# Altium footprint library ICL_komponenty_v1.PcbLib: 160 footprints (part 4 of 10)
Each footprint in its own frame and in the unit in brackets; x right, y up, seen from the top. Pads: shape width x height; smd on the part's side, far side on the other; paste and mask are expansions set on the pad; w line width, h text height; cw(c..) or ccw(c..) is an arc to the next point about the centre after c.
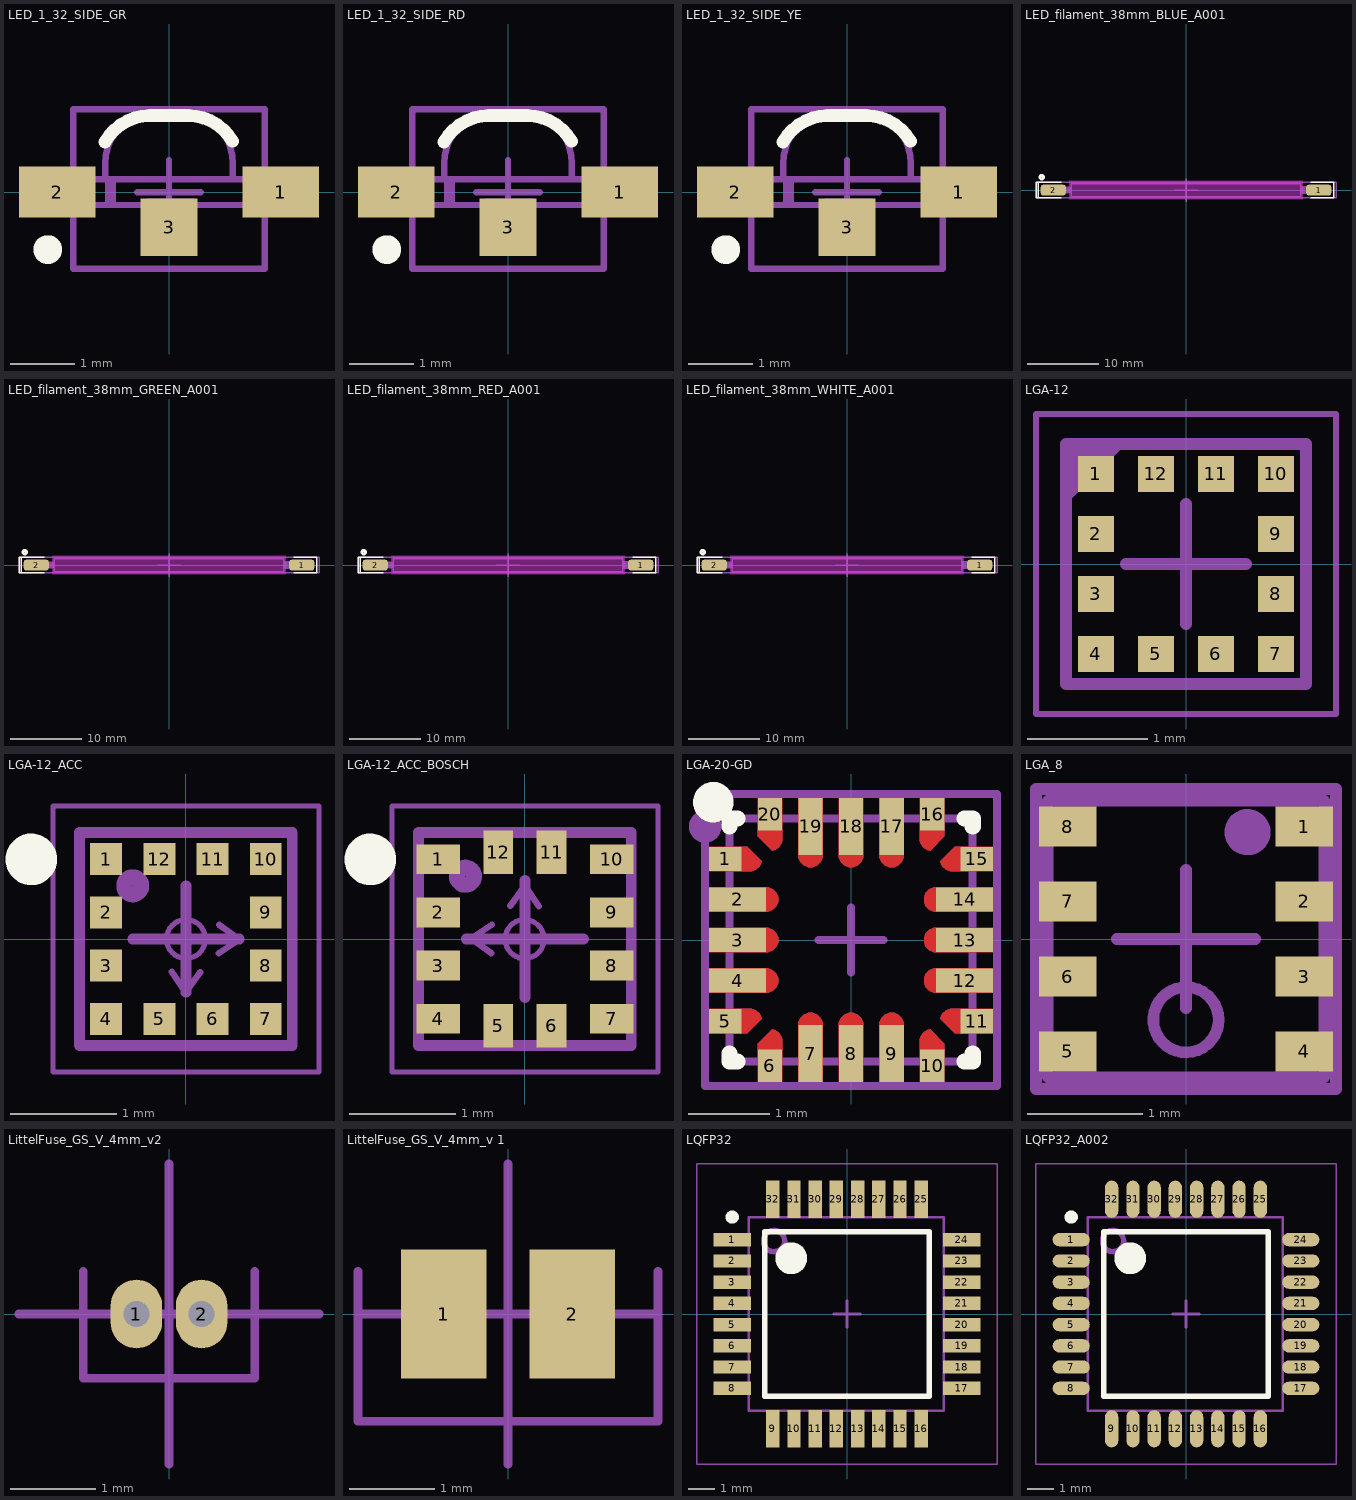
[diagram p3: the footprints below, top view; thin cyan lines are the x and y axes]

## LED_1_32_SIDE_GR [mm] "1x3.2mm side view green LED"
height 0.381
pads (3):
  rect 1.2x0.8 smd: 1(1.75,0) 2(-1.75,0)
  rect 0.9x0.9 smd: 3(0,-0.55)
Top Overlay:
  circle w0.25: c-1.9,-0.9 r0.1
  lines w0.2: -1.001,0.785 cw(c-0.3,0.4) -0.3,1.2 0.3,1.2 cw(c0.3,0.4) 0.995,0.797
Top M11-12_SMOT:
  rectangle: -1.6,-0.2 -1.363,0.199
  rectangle: 1.363,-0.2 1.6,0.199
  rectangle: -0.349,-0.2 0.4,-0.1
  rectangle: -1,-0.2 -0.834,0.2
  lines w0.1: -1,0.2 -1,0.45 cw(c-0.2,0.45) -0.2,1.25 0.2,1.25 cw(c0.2,0.45) 1,0.45 1,0.2 ; -1.6,-0.2 1.6,-0.2 1.6,0.2 -1.6,0.2 -1.6,-0.2
Top M13-14_SDES:
  text "'.Designator'" at -2.732,-1.608 h0.5
Top M15-16_SORG:
  lines w0.1: -0.5,0 0.5,0 ; 0,-0.5 0,0.5 ; -1.5,-1.2 1.5,-1.2 1.5,1.3 -1.5,1.3 -1.5,-1.2
3D body "APA3010GCCK_GREEN.step": height 1, standoff 0.01, extent -1.5,-0.7 1.5,1.3

## LED_1_32_SIDE_RD [mm] "1x3.2mm side view red LED"
height 0.381
pads (3):
  rect 1.2x0.8 smd: 1(1.75,0) 2(-1.75,0)
  rect 0.9x0.9 smd: 3(0,-0.55)
Top Overlay:
  circle w0.25: c-1.9,-0.9 r0.1
  lines w0.2: -1.001,0.785 cw(c-0.3,0.4) -0.3,1.2 0.3,1.2 cw(c0.3,0.4) 0.995,0.797
Top M11-12_SMOT:
  rectangle: -1,-0.2 -0.834,0.2
  rectangle: -0.349,-0.2 0.4,-0.1
  rectangle: 1.363,-0.2 1.6,0.199
  rectangle: -1.6,-0.2 -1.363,0.199
  lines w0.1: -1,0.2 -1,0.45 cw(c-0.2,0.45) -0.2,1.25 0.2,1.25 cw(c0.2,0.45) 1,0.45 1,0.2 ; -1.6,-0.2 -1.6,0.2 1.6,0.2 1.6,-0.2 -1.6,-0.2
Top M13-14_SDES:
  text "'.Designator'" at -2.732,-1.608 h0.5
Top M15-16_SORG:
  lines w0.1: -0.5,0 0.5,0 ; 0,-0.5 0,0.5 ; -1.5,-1.2 -1.5,1.3 1.5,1.3 1.5,-1.2 -1.5,-1.2
3D body "APA3010GCCK_RED.step": height 1, standoff 0.01, extent -1.5,-0.7 1.5,1.3

## LED_1_32_SIDE_YE [mm] "1x3.2mm side view yelow LED"
height 0.381
pads (3):
  rect 1.2x0.8 smd: 1(1.75,0) 2(-1.75,0)
  rect 0.9x0.9 smd: 3(0,-0.55)
Top Overlay:
  circle w0.25: c-1.9,-0.9 r0.1
  lines w0.2: -1.001,0.785 cw(c-0.3,0.4) -0.3,1.2 0.3,1.2 cw(c0.3,0.4) 0.995,0.797
Top M11-12_SMOT:
  rectangle: -1,-0.2 -0.834,0.2
  rectangle: -0.349,-0.2 0.4,-0.1
  rectangle: 1.363,-0.2 1.6,0.199
  rectangle: -1.6,-0.2 -1.363,0.199
  lines w0.1: -1,0.2 -1,0.45 cw(c-0.2,0.45) -0.2,1.25 0.2,1.25 cw(c0.2,0.45) 1,0.45 1,0.2 ; -1.6,-0.2 -1.6,0.2 1.6,0.2 1.6,-0.2 -1.6,-0.2
Top M13-14_SDES:
  text "'.Designator'" at -2.732,-1.608 h0.5
Top M15-16_SORG:
  lines w0.1: -0.5,0 0.5,0 ; 0,-0.5 0,0.5 ; -1.5,-1.2 -1.5,1.3 1.5,1.3 1.5,-1.2 -1.5,-1.2
3D body "APA3010GCCK_YELLOW.step": height 1, standoff 0.01, extent -1.5,-0.7 1.5,1.3

## LED_filament_38mm_BLUE_A001 [mm]
pads (2):
  rrect50% 3.5x1.5 smd: 1(18.5,0) 2(-18.5,0)
Top Overlay:
  circle w0.4: c-20.1,1.8 r0.25
  lines w0.2: -17.4,-1.1 -20.6,-1.1 ; -17.4,1.1 -20.6,1.1 ; 17.4,-1.1 20.6,-1.1 20.6,1.1 17.4,1.1 ; -20.6,-1.1 -20.9,-1.1 -20.9,1.1 -20.6,1.1 ; -20.6,-1.1 -20.6,1.1
Keep-Out Layer:
  board cut-out: -16.3,1.3 -16.3,-1.3 16.3,-1.3 16.3,1.3
Top M11-12_SMOT:
  circle w0.2: c16.9,0 r0.361
  rectangle: -19.1,-0.5 -16,0.5
  region: 19.1,0.5 17.261,0.5 17.261,-0.5 19.1,-0.5
  region: 16.9,0.5 16,0.5 16,-0.5 16.9,-0.5 16.9,-0.361 16.879,-0.361 16.813,-0.354 16.691,-0.303 16.597,-0.21 16.547,-0.087 16.54,-0.021 16.54,0.001 16.547,0.071 16.601,0.201 16.7,0.3 16.83,0.354 16.9,0.361
  region: 17.3,0.5 16.9,0.5 16.9,0.361 16.97,0.354 17.1,0.3 17.2,0.2 17.254,0.07 17.261,0 17.261,-0.005 17.254,-0.074 17.201,-0.203 17.103,-0.301 16.974,-0.354 16.905,-0.361 16.9,-0.361 16.9,-0.5 17.3,-0.5
  lines w0.2: -16,-0.9 16,-0.9 16,0.9 -16,0.9 -16,-0.9
Top M15-16_SORG:
  lines w0.2: -1.6,0 0,0 ; 0,-1.6 0,0 ; 0,1.6 0,0 ; 1.6,0 0,0 ; -20.9,-1.1 20.9,-1.1 20.9,1.1 -20.9,1.1 -20.9,-1.1
3D body "fil_38mm_blue.stp": height 0.76, standoff -1.04, extent -19,-0.9 19,0.9

## LED_filament_38mm_GREEN_A001 [mm]
pads (2):
  rrect50% 3.5x1.5 smd: 1(18.5,0) 2(-18.5,0)
Top Overlay:
  circle w0.4: c-20.1,1.8 r0.25
  lines w0.2: -17.4,-1.1 -20.6,-1.1 ; -17.4,1.1 -20.6,1.1 ; 17.4,-1.1 20.6,-1.1 20.6,1.1 17.4,1.1 ; -20.6,-1.1 -20.6,1.1 ; -20.6,-1.1 -20.9,-1.1 -20.9,1.1 -20.6,1.1
Keep-Out Layer:
  board cut-out: -16.3,1.3 -16.3,-1.3 16.3,-1.3 16.3,1.3
Top M11-12_SMOT:
  circle w0.2: c16.9,0 r0.361
  region: 19.1,0.5 17.261,0.5 17.261,-0.5 19.1,-0.5
  rectangle: -19.1,-0.5 -16,0.5
  region: 17.3,0.5 16.9,0.5 16.9,0.361 16.97,0.354 17.1,0.3 17.2,0.2 17.254,0.07 17.261,0 17.261,-0.005 17.254,-0.074 17.201,-0.203 17.103,-0.301 16.974,-0.354 16.905,-0.361 16.9,-0.361 16.9,-0.5 17.3,-0.5
  region: 16.9,0.5 16,0.5 16,-0.5 16.9,-0.5 16.9,-0.361 16.879,-0.361 16.813,-0.354 16.691,-0.303 16.597,-0.21 16.547,-0.087 16.54,-0.021 16.54,0.001 16.547,0.071 16.601,0.201 16.7,0.3 16.83,0.354 16.9,0.361
  lines w0.2: -16,-0.9 -16,0.9 16,0.9 16,-0.9 -16,-0.9
Top M15-16_SORG:
  lines w0.2: -1.6,0 0,0 ; 0,-1.6 0,0 ; 0,1.6 0,0 ; 1.6,0 0,0 ; -20.9,-1.1 -20.9,1.1 20.9,1.1 20.9,-1.1 -20.9,-1.1
3D body "fil_38mm_green.stp": height 0.76, standoff -1.04, extent -19,-0.9 19,0.9

## LED_filament_38mm_RED_A001 [mm]
pads (2):
  rrect50% 3.5x1.5 smd: 1(18.5,0) 2(-18.5,0)
Top Overlay:
  circle w0.4: c-20.1,1.8 r0.25
  lines w0.2: -17.4,-1.1 -20.6,-1.1 ; -17.4,1.1 -20.6,1.1 ; 17.4,-1.1 20.6,-1.1 20.6,1.1 17.4,1.1 ; -20.6,-1.1 -20.6,1.1 ; -20.6,-1.1 -20.9,-1.1 -20.9,1.1 -20.6,1.1
Keep-Out Layer:
  board cut-out: -16.3,1.3 -16.3,-1.3 16.3,-1.3 16.3,1.3
Top M11-12_SMOT:
  circle w0.2: c16.9,0 r0.361
  region: 19.1,0.5 17.261,0.5 17.261,-0.5 19.1,-0.5
  rectangle: -19.1,-0.5 -16,0.5
  region: 17.3,0.5 16.9,0.5 16.9,0.361 16.97,0.354 17.1,0.3 17.2,0.2 17.254,0.07 17.261,0 17.261,-0.005 17.254,-0.074 17.201,-0.203 17.103,-0.301 16.974,-0.354 16.905,-0.361 16.9,-0.361 16.9,-0.5 17.3,-0.5
  region: 16.9,0.5 16,0.5 16,-0.5 16.9,-0.5 16.9,-0.361 16.879,-0.361 16.813,-0.354 16.691,-0.303 16.597,-0.21 16.547,-0.087 16.54,-0.021 16.54,0.001 16.547,0.071 16.601,0.201 16.7,0.3 16.83,0.354 16.9,0.361
  lines w0.2: -16,-0.9 -16,0.9 16,0.9 16,-0.9 -16,-0.9
Top M15-16_SORG:
  lines w0.2: -1.6,0 0,0 ; 0,-1.6 0,0 ; 0,1.6 0,0 ; 1.6,0 0,0 ; -20.9,-1.1 -20.9,1.1 20.9,1.1 20.9,-1.1 -20.9,-1.1
3D body "fil_38mm_red.stp": height 0.76, standoff -1.04, extent -19,-0.9 19,0.9

## LED_filament_38mm_WHITE_A001 [mm]
pads (2):
  rrect50% 3.5x1.5 smd: 1(18.5,0) 2(-18.5,0)
Top Overlay:
  circle w0.4: c-20.1,1.8 r0.25
  lines w0.2: -17.4,-1.1 -20.6,-1.1 ; -17.4,1.1 -20.6,1.1 ; 17.4,-1.1 20.6,-1.1 20.6,1.1 17.4,1.1 ; -20.6,-1.1 -20.6,1.1 ; -20.6,-1.1 -20.9,-1.1 -20.9,1.1 -20.6,1.1
Keep-Out Layer:
  board cut-out: -16.3,1.3 -16.3,-1.3 16.3,-1.3 16.3,1.3
Top M11-12_SMOT:
  circle w0.2: c16.9,0 r0.361
  region: 19.1,0.5 17.261,0.5 17.261,-0.5 19.1,-0.5
  rectangle: -19.1,-0.5 -16,0.5
  region: 16.9,0.5 16,0.5 16,-0.5 16.9,-0.5 16.9,-0.361 16.879,-0.361 16.813,-0.354 16.691,-0.303 16.597,-0.21 16.547,-0.087 16.54,-0.021 16.54,0.001 16.547,0.071 16.601,0.201 16.7,0.3 16.83,0.354 16.9,0.361
  region: 17.3,0.5 16.9,0.5 16.9,0.361 16.97,0.354 17.1,0.3 17.2,0.2 17.254,0.07 17.261,0 17.261,-0.005 17.254,-0.074 17.201,-0.203 17.103,-0.301 16.974,-0.354 16.905,-0.361 16.9,-0.361 16.9,-0.5 17.3,-0.5
  lines w0.2: -16,-0.9 16,-0.9 16,0.9 -16,0.9 -16,-0.9
Top M15-16_SORG:
  lines w0.2: -1.6,0 0,0 ; 0,-1.6 0,0 ; 0,1.6 0,0 ; 1.6,0 0,0 ; -20.9,-1.1 20.9,-1.1 20.9,1.1 -20.9,1.1 -20.9,-1.1
3D body "fil_38mm_white.stp": height 0.76, standoff -1.04, extent -19,-0.9 19,0.9

## LGA-12 [mm] "LGA, 12-Leads, Body 2,00x2,00mmx0,70mm, Pitch 0,50mm"
height 0.7
pads (12):
  rect 0.3x0.3 smd mask+0.1: 1(-0.75,0.75) 2(-0.75,0.25) 3(-0.75,-0.25) 4(-0.75,-0.75) 5(-0.25,-0.75) 6(0.25,-0.75) 7(0.75,-0.75) 8(0.75,-0.25) 9(0.75,0.25) 10(0.75,0.75) 11(0.25,0.75) 12(-0.25,0.75)
Top Solder:
  rectangle: -1,0.5 1,1
  rectangle: 0.5,-0.7 1,0.7
  rectangle: -1,-1 1,-0.5
  rectangle: -1,-0.7 -0.5,0.7
Top M11-12_SMOT:
  rectangle: -0.35,0.65 -0.15,0.85
  rectangle: -0.85,0.65 -0.65,0.85
  rectangle: 0.15,0.65 0.35,0.85
  rectangle: 0.65,0.65 0.85,0.85
  rectangle: 0.65,0.15 0.85,0.35
  rectangle: -0.85,0.15 -0.65,0.35
  rectangle: -0.85,-0.35 -0.65,-0.15
  rectangle: 0.65,-0.35 0.85,-0.15
  rectangle: 0.65,-0.85 0.85,-0.65
  rectangle: 0.15,-0.85 0.35,-0.65
  rectangle: -0.35,-0.85 -0.15,-0.65
  rectangle: -0.85,-0.85 -0.65,-0.65
  region: -1,1 -0.5,1 -1,0.5
  lines w0.1: -1,-1 1,-1 1,1 -1,1 -1,-1
Top M13-14_SDES:
  text "'.Designator'" at -3.399,-0.25 h0.6
Top M15-16_SORG:
  lines w0.05: -1.25,-1.25 -1.25,1.25 1.25,1.25 1.25,-1.25 -1.25,-1.25
  lines w0.1: -0.5,0 0.5,0 ; 0,-0.5 0,0.5
3D body: height 0.7, standoff 0, extent -1,-1 1,1

## LGA-12_ACC [mm] "LGA, 12-Leads, Body 2,00x2,00mmx0,70mm, Pitch 0,50mm"
height 0.7
pads (12):
  rect 0.3x0.3 smd mask+0.1: 1(-0.75,0.75) 2(-0.75,0.25) 3(-0.75,-0.25) 4(-0.75,-0.75) 5(-0.25,-0.75) 6(0.25,-0.75) 7(0.75,-0.75) 8(0.75,-0.25) 9(0.75,0.25) 10(0.75,0.75) 11(0.25,0.75) 12(-0.25,0.75)
Top Overlay:
  circle w0.254: c-1.453,0.748 r0.115
Top Solder:
  rectangle: -1,0.5 1,1
  rectangle: 0.5,-0.7 1,0.7
  rectangle: -1,-1 1,-0.5
  rectangle: -1,-0.7 -0.5,0.7
Top M11-12_SMOT:
  circle w0.15: c-0.5,0.5 r0.08
  rectangle: -0.35,0.65 -0.15,0.85
  rectangle: -0.85,0.65 -0.65,0.85
  rectangle: 0.15,0.65 0.35,0.85
  rectangle: 0.65,0.65 0.85,0.85
  rectangle: 0.65,0.15 0.85,0.35
  rectangle: 0.65,-0.35 0.85,-0.15
  rectangle: -0.85,-0.35 -0.65,-0.15
  rectangle: -0.85,0.15 -0.65,0.35
  rectangle: -0.85,-0.85 -0.65,-0.65
  rectangle: -0.35,-0.85 -0.15,-0.65
  rectangle: 0.15,-0.85 0.35,-0.65
  rectangle: 0.65,-0.85 0.85,-0.65
  lines w0.1: -1,-1 1,-1 1,1 -1,1 -1,-1
Top M13-14_SDES:
  text "'.Designator'" at -3.399,-0.25 h0.6
Top M15-16_SORG:
  lines w0.05: -1.25,-1.25 -1.25,1.25 1.25,1.25 1.25,-1.25 -1.25,-1.25
  lines w0.1: -0.5,0 0,0 ; 0,-0.5 0,0 ; 0,0.5 0,0 ; 0.5,0 0,0
Bottom M15-16_SORG:
  circle w0.05: c0,0 r0.182
  circle w0.05: c-0.001,-0.002 r0.047
  lines w0.06: -0.5,0 0.5,0 0.312,0.133 ; -0.135,-0.308 -0.002,-0.506 ; 0,0.5 0,-0.5 0.133,-0.312 ; 0.308,-0.135 0.506,-0.002
  text "Z+" at -0.465,0.116 h0.2
  text "X+" at 0.615,-0.097 h0.2
  text "Y+" at -0.062,-0.862 h0.2
3D body: height 0.7, standoff 0, extent -1,-1 1,1

## LGA-12_ACC_BOSCH [mm] "LGA, 12-Leads, Body 2,00x2,00mmx0,70mm, Pitch 0,50mm"
height 0.7
pads (12):
  rect 0.41x0.28 smd mask+0.1: 1(-0.815,0.75) 2(-0.815,0.25) 3(-0.815,-0.25) 4(-0.815,-0.75) 7(0.815,-0.75) 8(0.815,-0.25) 9(0.815,0.25) 10(0.815,0.75)
  rect 0.28x0.41 smd mask+0.1: 5(-0.25,-0.815) 6(0.25,-0.815) 11(0.25,0.815) 12(-0.25,0.815)
Top Overlay:
  circle w0.254: c-1.453,0.748 r0.115
Top Solder:
  rectangle: -1,-0.7 -0.5,0.7
  rectangle: -1,-1 1,-0.5
  rectangle: 0.5,-0.999 1.117,0.988
  rectangle: -0.65,0.5 1.119,0.989
  rectangle: -1.116,-0.991 -0.503,0.99
  rectangle: -0.119,0.9 0.15,1.119
  rectangle: -0.112,-1.118 0.2,-0.95
Top M11-12_SMOT:
  circle w0.15: c-0.56,0.59 r0.08
  rectangle: -0.3,0.7 -0.2,0.9
  rectangle: 0.2,0.7 0.3,0.9
  region: -0.7,0.7 -0.7,0.8 -0.9,0.8 -0.9,0.7
  region: -0.7,0.2 -0.7,0.3 -0.9,0.3 -0.9,0.2
  region: -0.7,-0.3 -0.7,-0.2 -0.9,-0.2 -0.9,-0.3
  region: -0.7,-0.8 -0.7,-0.7 -0.9,-0.7 -0.9,-0.8
  region: 0.7,-0.7 0.7,-0.8 0.9,-0.8 0.9,-0.7
  region: 0.7,-0.2 0.7,-0.3 0.9,-0.3 0.9,-0.2
  region: 0.7,0.3 0.7,0.2 0.9,0.2 0.9,0.3
  region: 0.7,0.8 0.7,0.7 0.9,0.7 0.9,0.8
  region: 0.3,-0.7 0.2,-0.7 0.2,-0.9 0.3,-0.9
  region: -0.2,-0.7 -0.3,-0.7 -0.3,-0.9 -0.2,-0.9
  lines w0.1: -1,-1 1,-1 1,1 -1,1 -1,-1
Top M13-14_SDES:
  text "'.Designator'" at -3.399,-0.25 h0.6
Top M15-16_SORG:
  lines w0.05: -1.25,-1.25 1.25,-1.25 1.25,1.25 -1.25,1.25 -1.25,-1.25
  lines w0.1: -0.55,0 0,0 ; 0,-0.55 0,0 ; 0,0.55 0,0 ; 0.55,0 0,0
Bottom M15-16_SORG:
  circle w0.05: c-0.001,-0.001 r0.047
  circle w0.05: c-0.003,0 r0.182
  lines w0.06: -0.509,0.002 -0.312,0.134 ; -0.315,-0.134 -0.503,0 0.497,0 ; -0.137,0.311 -0.003,0.5 -0.003,-0.5 ; -0.001,0.505 0.131,0.308
  text "Z+" at -0.119,-0.466 h0.2
  text "Y+" at -0.601,-0.167 h0.2
  text "X+" at 0.094,0.614 h0.2
3D body: height 0.7, standoff 0, extent -1,-1 1,1

## LGA-20-GD [mm] "GigaDevice LGA20"
height 0.61
pads (20):
  rect 0.4x0.3 smd paste-0.15 mask-0.15: 1(-1.55,1) 5(-1.55,-1) 11(1.55,-1) 15(1.55,1)
  rect 0.7x0.3 smd paste-0.15 mask-0.15: 2(-1.4,0.5) 3(-1.4,0) 4(-1.4,-0.5) 12(1.4,-0.5) 13(1.4,0) 14(1.4,0.5)
  rect 0.3x0.4 smd paste-0.15 mask-0.15: 6(-1,-1.55) 10(1,-1.55) 16(1,1.55) 20(-1,1.55)
  rect 0.3x0.7 smd paste-0.15 mask-0.15: 7(-0.5,-1.4) 8(0,-1.4) 9(0.5,-1.4) 17(0.5,1.4) 18(0,1.4) 19(-0.5,1.4)
Top Layer:
  region: -1.75,0.85 -1.25,0.85 -1.224,0.85 -1.174,0.868 -1.133,0.902 -1.107,0.948 -1.102,0.974 -1.278,1.15 -1.75,1.15
  region: -1.15,1.278 -1.15,1.75 -0.85,1.75 -0.85,1.25 -0.85,1.224 -0.868,1.174 -0.902,1.133 -0.948,1.107 -0.974,1.102
  region: -0.65,1.05 -0.65,1.75 -0.35,1.75 -0.35,1.05 -0.35,1.02 -0.373,0.965 -0.415,0.923 -0.47,0.9 -0.53,0.9 -0.585,0.923 -0.627,0.965 -0.65,1.02
  region: -0.15,1.05 -0.15,1.02 -0.127,0.965 -0.085,0.923 -0.03,0.9 0.03,0.9 0.085,0.923 0.127,0.965 0.15,1.02 0.15,1.05 0.15,1.75 -0.15,1.75
  region: 0.35,1.05 0.35,1.02 0.373,0.965 0.415,0.923 0.47,0.9 0.53,0.9 0.585,0.923 0.627,0.965 0.65,1.02 0.65,1.05 0.65,1.75 0.35,1.75
  region: 0.85,1.25 0.85,1.75 1.15,1.75 1.15,1.278 0.974,1.102 0.948,1.107 0.902,1.133 0.868,1.174 0.85,1.224
  region: 1.102,0.974 1.107,0.948 1.133,0.902 1.174,0.868 1.224,0.85 1.25,0.85 1.75,0.85 1.75,1.15 1.278,1.15
  region: 1.05,0.35 1.02,0.35 0.965,0.373 0.923,0.415 0.9,0.47 0.9,0.53 0.923,0.585 0.965,0.627 1.02,0.65 1.05,0.65 1.75,0.65 1.75,0.35
  region: 1.05,-0.15 1.75,-0.15 1.75,0.15 1.05,0.15 1.02,0.15 0.965,0.127 0.923,0.085 0.9,0.03 0.9,-0.03 0.923,-0.085 0.965,-0.127 1.02,-0.15
  region: 1.05,-0.65 1.02,-0.65 0.965,-0.627 0.923,-0.585 0.9,-0.53 0.9,-0.47 0.923,-0.415 0.965,-0.373 1.02,-0.35 1.05,-0.35 1.75,-0.35 1.75,-0.65
  region: 1.102,-0.974 1.278,-1.15 1.75,-1.15 1.75,-0.85 1.25,-0.85 1.224,-0.85 1.174,-0.868 1.133,-0.902 1.107,-0.948
  region: 0.85,-1.75 1.15,-1.75 1.15,-1.278 0.974,-1.102 0.948,-1.107 0.902,-1.133 0.868,-1.174 0.85,-1.224 0.85,-1.25
  region: 0.35,-1.75 0.35,-1.05 0.35,-1.02 0.373,-0.965 0.415,-0.923 0.47,-0.9 0.53,-0.9 0.585,-0.923 0.627,-0.965 0.65,-1.02 0.65,-1.05 0.65,-1.75
  region: -0.15,-1.75 -0.15,-1.05 -0.15,-1.02 -0.127,-0.965 -0.085,-0.923 -0.03,-0.9 0.03,-0.9 0.085,-0.923 0.127,-0.965 0.15,-1.02 0.15,-1.05 0.15,-1.75
  region: -0.65,-1.75 -0.35,-1.75 -0.35,-1.05 -0.35,-1.02 -0.373,-0.965 -0.415,-0.923 -0.47,-0.9 -0.53,-0.9 -0.585,-0.923 -0.627,-0.965 -0.65,-1.02 -0.65,-1.05
  region: -1.15,-1.75 -0.85,-1.75 -0.85,-1.25 -0.85,-1.224 -0.868,-1.174 -0.902,-1.133 -0.948,-1.107 -0.974,-1.102 -1.15,-1.278
  region: -1.75,-1.15 -1.278,-1.15 -1.102,-0.974 -1.107,-0.948 -1.133,-0.902 -1.174,-0.868 -1.224,-0.85 -1.25,-0.85 -1.75,-0.85
  region: -1.75,-0.65 -1.05,-0.65 -1.02,-0.65 -0.965,-0.627 -0.923,-0.585 -0.9,-0.53 -0.9,-0.47 -0.923,-0.415 -0.965,-0.373 -1.02,-0.35 -1.05,-0.35 -1.75,-0.35
  region: -1.75,-0.15 -1.75,0.15 -1.05,0.15 -1.02,0.15 -0.965,0.127 -0.923,0.085 -0.9,0.03 -0.9,-0.03 -0.923,-0.085 -0.965,-0.127 -1.02,-0.15 -1.05,-0.15
  region: -1.75,0.35 -1.75,0.65 -1.05,0.65 -1.02,0.65 -0.965,0.627 -0.923,0.585 -0.9,0.53 -0.9,0.47 -0.923,0.415 -0.965,0.373 -1.02,0.35 -1.05,0.35
Top Overlay:
  circle w0.25: c-1.7,1.7 r0.125
  lines w0.2: -1.5,-1.4 -1.5,-1.5 -1.4,-1.5 ; -1.5,1.4 -1.5,1.5 -1.4,1.5 ; 1.4,-1.5 1.5,-1.5 1.5,-1.4 ; 1.4,1.5 1.5,1.5 1.5,1.4
Top Paste:
  drawing of 20 lines, arcs and shapes, not listed
Top Solder:
  region: -0.838,0.838 -1.198,1.198 -1.198,1.8 1.2,1.8 1.2,1.207 0.831,0.838
  region: -0.836,-0.836 -1.198,-1.198 -1.8,-1.198 -1.8,1.2 -1.2,1.2 -0.836,0.836
  region: 0.837,-0.837 1.198,-1.198 1.198,-1.8 -1.2,-1.8 -1.2,-1.2 -0.837,-0.837
  region: 0.833,0.839 1.192,1.198 1.8,1.198 1.8,-1.2 1.2,-1.2 0.833,-0.833
Top M11-12_SMOT:
  drawing of 26 lines, arcs and shapes, not listed
Top M13-14_SDES:
  text "'.Designator'" at -3.399,-0.25 h0.6
Top M15-16_SORG:
  lines w0.1: -0.4,0 0.4,0 ; 0,-0.4 0,0.4 ; -1.8,-1.8 -1.8,1.8 1.8,1.8 1.8,-1.8 -1.8,-1.8
3D body "LGA-20-GD.step": height 0.61, standoff 0, extent -1.55,-1.55 1.55,1.55

## LGA_8 [mm] "BME280 bosh"
pads (8):
  rect 0.5x0.35 smd: 1(1.025,0.975) 2(1.025,0.325) 3(1.025,-0.325) 4(1.025,-0.975) 5(-1.025,-0.975) 6(-1.025,-0.325) 7(-1.025,0.325) 8(-1.025,0.975)
Top M11-12_SMOT:
  circle w0.2: c0.533,0.926 r0.1
  circle w0.1: c0,-0.7 r0.283
  rectangle: -1.2,-0.449 -0.808,-0.2
  rectangle: -1.2,-1.099 -0.808,-0.85
  rectangle: -1.2,0.851 -0.808,1.1
  rectangle: -1.2,0.201 -0.808,0.45
  region: 1.2,-0.851 0.808,-0.851 0.808,-1.1 1.2,-1.1
  region: 1.2,-0.201 0.808,-0.201 0.808,-0.45 1.2,-0.45
  region: 1.2,0.449 0.808,0.449 0.808,0.2 1.2,0.2
  region: 1.2,1.099 0.808,1.099 0.808,0.85 1.2,0.85
  lines w0.1: -1.2,-1.2 -1.2,1.2 1.2,1.2 1.2,-1.2 -1.2,-1.2
Top M13-14_SDES:
  text "'.Designator'" at 0.25,-3.399 h0.6
Top M15-16_SORG:
  lines w0.1: -0.6,0 0,0 ; 0,-0.6 0,0 ; 0,0.6 0,0 ; 0.6,0 0,0 ; -1.3,-1.3 -1.3,1.3 1.3,1.3 1.3,-1.3 -0.9,-1.3 -1.3,-1.3
3D body "Bosch_BME280.step": height 0.94, standoff 0.01, extent -1.25,-1.25 1.25,1.25

## LittelFuse_GS_V_4mm_v2 [mm] "NTC glass drop"
pads (2):
  oval 0.6x0.8 hole 0.3: 1(-0.38,0) 2(0.38,0)
Top M15-16_SORG:
  lines w0.1: -1.75,0 0,0 ; 0,-1.75 0,0 ; 0,1.75 0,0 ; 1.75,0 0,0
Top M17-18_TDES:
  text "'.Designator'" at -5.715,1.433 h1
Top M19-20_TMOT:
  lines w0.1: -1,0.5 -1,-0.75 1,-0.75 1,0.5
3D body "littelfuse_GS_v3.STEP": height 0.91, standoff -2.35, extent -0.762,-0.138 0.762,5.762

## LittelFuse_GS_V_4mm_v 1 [mm] "NTC glass drop"
pads (2):
  rect 1x1.5 smd: 1(-0.75,0) 2(0.75,0)
Top M15-16_SORG:
  lines w0.1: -1.75,0 0,0 ; 0,-1.75 0,0 ; 0,1.75 0,0 ; 1.75,0 0,0
Top M17-18_TDES:
  text "'.Designator'" at -5.715,1.433 h1
Top M19-20_TMOT:
  lines w0.1: -1.75,0.5 -1.75,-1.25 1.75,-1.25 1.75,0.5
3D body "littelfuse_GS_v2.STEP": height 0.56, standoff -0.96, extent -0.762,-0.667 0.762,5.762

## LQFP32 [mm] "TQFP, 32-Leads, Body 7,00x7,00mm, Pitch 0,80mm, IPC Low Density"
height 1.6
pads (32):
  rect 1.4x0.5 smd: 1(-4.325,2.8) 2(-4.325,2) 3(-4.325,1.2) 4(-4.325,0.4) 5(-4.325,-0.4) 6(-4.325,-1.2) 7(-4.325,-2) 8(-4.325,-2.8) 17(4.325,-2.8) 18(4.325,-2) 19(4.325,-1.2) 20(4.325,-0.4) 21(4.325,0.4) 22(4.325,1.2) 23(4.325,2) 24(4.325,2.8)
  rect 0.5x1.4 smd: 9(-2.8,-4.325) 10(-2,-4.325) 11(-1.2,-4.325) 12(-0.4,-4.325) 13(0.4,-4.325) 14(1.2,-4.325) 15(2,-4.325) 16(2.8,-4.325) 25(2.8,4.325) 26(2,4.325) 27(1.2,4.325) 28(0.4,4.325) 29(-0.4,4.325) 30(-1.2,4.325) 31(-2,4.325) 32(-2.8,4.325)
Top Overlay:
  circle w0.25: c-4.325,3.65 r0.125
  circle w0.6: c-2.1,2.1 r0.3
  lines w0.2: -3.1,-3.1 -3.1,3.1 3.1,3.1 3.1,-3.1 -3.1,-3.1
Top M11-12_SMOT:
  circle w0.2: c-2.75,2.75 r0.4
  region: -3.65,2.65 -3.65,2.95 -4.45,2.95 -4.45,2.65
  region: -3.65,1.85 -3.65,2.15 -4.45,2.15 -4.45,1.85
  region: -3.65,1.05 -3.65,1.35 -4.45,1.35 -4.45,1.05
  region: -3.65,0.25 -3.65,0.55 -4.45,0.55 -4.45,0.25
  region: -3.65,-0.55 -3.65,-0.25 -4.45,-0.25 -4.45,-0.55
  region: -3.65,-1.35 -3.65,-1.05 -4.45,-1.05 -4.45,-1.35
  region: -3.65,-2.15 -3.65,-1.85 -4.45,-1.85 -4.45,-2.15
  region: -3.65,-2.95 -3.65,-2.65 -4.45,-2.65 -4.45,-2.95
  region: -2.65,-3.65 -2.95,-3.65 -2.95,-4.45 -2.65,-4.45
  region: -1.85,-3.65 -2.15,-3.65 -2.15,-4.45 -1.85,-4.45
  region: -1.05,-3.65 -1.35,-3.65 -1.35,-4.45 -1.05,-4.45
  region: -0.25,-3.65 -0.55,-3.65 -0.55,-4.45 -0.25,-4.45
  region: 0.55,-3.65 0.25,-3.65 0.25,-4.45 0.55,-4.45
  region: 1.35,-3.65 1.05,-3.65 1.05,-4.45 1.35,-4.45
  region: 2.15,-3.65 1.85,-3.65 1.85,-4.45 2.15,-4.45
  region: 2.95,-3.65 2.65,-3.65 2.65,-4.45 2.95,-4.45
  region: 3.65,-2.65 3.65,-2.95 4.45,-2.95 4.45,-2.65
  region: 3.65,-1.85 3.65,-2.15 4.45,-2.15 4.45,-1.85
  region: 3.65,-1.05 3.65,-1.35 4.45,-1.35 4.45,-1.05
  region: 3.65,-0.25 3.65,-0.55 4.45,-0.55 4.45,-0.25
  region: 3.65,0.55 3.65,0.25 4.45,0.25 4.45,0.55
  region: 3.65,1.35 3.65,1.05 4.45,1.05 4.45,1.35
  region: 3.65,2.15 3.65,1.85 4.45,1.85 4.45,2.15
  region: 3.65,2.95 3.65,2.65 4.45,2.65 4.45,2.95
  rectangle: 2.65,3.65 2.95,4.45
  rectangle: 1.85,3.65 2.15,4.45
  rectangle: 1.05,3.65 1.35,4.45
  rectangle: 0.25,3.65 0.55,4.45
  rectangle: -0.55,3.65 -0.25,4.45
  rectangle: -1.35,3.65 -1.05,4.45
  rectangle: -2.15,3.65 -1.85,4.45
  rectangle: -2.95,3.65 -2.65,4.45
  lines w0.1: -3.7,-3.65 3.65,-3.65 3.65,3.65 -3.7,3.65 -3.7,-3.65
Top M13-14_SDES:
  text "'.Designator'" at -5.665,-0.417 h1
Top M15-16_SORG:
  lines w0.05: -5.65,-5.65 -5.65,5.65 5.65,5.65 5.65,-5.65 -5.65,-5.65
  lines w0.1: -0.5,0 0.5,0 ; 0,-0.5 0,0.5
3D body "LQFP32.step": height 1.6, standoff 0, extent -4.3,-4.3 4.3,4.3

## LQFP32_A002 [mm] "TQFP, 32-Leads, Body 7,00x7,00mm, Pitch 0,80mm, IPC Low Density"
height 1.6
pads (32):
  oval 1.4x0.5 smd: 1(-4.325,2.8) 2(-4.325,2) 3(-4.325,1.2) 4(-4.325,0.4) 5(-4.325,-0.4) 6(-4.325,-1.2) 7(-4.325,-2) 8(-4.325,-2.8) 17(4.325,-2.8) 18(4.325,-2) 19(4.325,-1.2) 20(4.325,-0.4) 21(4.325,0.4) 22(4.325,1.2) 23(4.325,2) 24(4.325,2.8)
  oval 0.5x1.4 smd: 9(-2.8,-4.325) 10(-2,-4.325) 11(-1.2,-4.325) 12(-0.4,-4.325) 13(0.4,-4.325) 14(1.2,-4.325) 15(2,-4.325) 16(2.8,-4.325) 25(2.8,4.325) 26(2,4.325) 27(1.2,4.325) 28(0.4,4.325) 29(-0.4,4.325) 30(-1.2,4.325) 31(-2,4.325) 32(-2.8,4.325)
Top Overlay:
  circle w0.25: c-4.325,3.65 r0.125
  circle w0.6: c-2.1,2.1 r0.3
  lines w0.2: -3.1,-3.1 -3.1,3.1 3.1,3.1 3.1,-3.1 -3.1,-3.1
Top M11-12_SMOT:
  circle w0.2: c-2.75,2.75 r0.4
  rectangle: -2.95,3.65 -2.65,4.45
  rectangle: -2.15,3.65 -1.85,4.45
  rectangle: -1.35,3.65 -1.05,4.45
  rectangle: -0.55,3.65 -0.25,4.45
  rectangle: 0.25,3.65 0.55,4.45
  rectangle: 1.05,3.65 1.35,4.45
  rectangle: 1.85,3.65 2.15,4.45
  rectangle: 2.65,3.65 2.95,4.45
  region: 3.65,2.95 3.65,2.65 4.45,2.65 4.45,2.95
  region: 3.65,2.15 3.65,1.85 4.45,1.85 4.45,2.15
  region: 3.65,1.35 3.65,1.05 4.45,1.05 4.45,1.35
  region: 3.65,0.55 3.65,0.25 4.45,0.25 4.45,0.55
  region: 3.65,-0.25 3.65,-0.55 4.45,-0.55 4.45,-0.25
  region: 3.65,-1.05 3.65,-1.35 4.45,-1.35 4.45,-1.05
  region: 3.65,-1.85 3.65,-2.15 4.45,-2.15 4.45,-1.85
  region: 3.65,-2.65 3.65,-2.95 4.45,-2.95 4.45,-2.65
  region: 2.95,-3.65 2.65,-3.65 2.65,-4.45 2.95,-4.45
  region: 2.15,-3.65 1.85,-3.65 1.85,-4.45 2.15,-4.45
  region: 1.35,-3.65 1.05,-3.65 1.05,-4.45 1.35,-4.45
  region: 0.55,-3.65 0.25,-3.65 0.25,-4.45 0.55,-4.45
  region: -0.25,-3.65 -0.55,-3.65 -0.55,-4.45 -0.25,-4.45
  region: -1.05,-3.65 -1.35,-3.65 -1.35,-4.45 -1.05,-4.45
  region: -1.85,-3.65 -2.15,-3.65 -2.15,-4.45 -1.85,-4.45
  region: -2.65,-3.65 -2.95,-3.65 -2.95,-4.45 -2.65,-4.45
  region: -3.65,-2.95 -3.65,-2.65 -4.45,-2.65 -4.45,-2.95
  region: -3.65,-2.15 -3.65,-1.85 -4.45,-1.85 -4.45,-2.15
  region: -3.65,-1.35 -3.65,-1.05 -4.45,-1.05 -4.45,-1.35
  region: -3.65,-0.55 -3.65,-0.25 -4.45,-0.25 -4.45,-0.55
  region: -3.65,0.25 -3.65,0.55 -4.45,0.55 -4.45,0.25
  region: -3.65,1.05 -3.65,1.35 -4.45,1.35 -4.45,1.05
  region: -3.65,1.85 -3.65,2.15 -4.45,2.15 -4.45,1.85
  region: -3.65,2.65 -3.65,2.95 -4.45,2.95 -4.45,2.65
  lines w0.1: -3.7,-3.65 -3.7,3.65 3.65,3.65 3.65,-3.65 -3.7,-3.65
Top M13-14_SDES:
  text "'.Designator'" at -5.665,-0.417 h1
Top M15-16_SORG:
  lines w0.05: -5.65,-5.65 -5.65,5.65 5.65,5.65 5.65,-5.65 -5.65,-5.65
  lines w0.1: -0.5,0 0.5,0 ; 0,-0.5 0,0.5
3D body "LQFP32.step": height 1.6, standoff 0, extent -4.3,-4.3 4.3,4.3